# Altium schematic symbol library Regulator_Linear.SchLib: 1452 symbols (part 9 of 10) (continued)
## TPS7A91 (continued)

## TPS7A0508PDBV
designator *  value TPS7A0508PDBV
ki_keywords: Single Output LDO Low-Iq; ki_description: 200-mA Ultra-Low-Iq LDO, 0.8V, SOT-23-5; ki_fp_filters: SOT?23*; Footprint: Package_TO_SOT_SMD:SOT-23-5; Supplier: https://www.ti.com/lit/ds/symlink/tps7a05.pdf
footprint SOT-23-5
pins: 1 IN (power), 2 GND (power), 3 EN (in), 4 NC (in) hidden, 5 OUT (power)

## TPS7A0510PDBV
designator *  value TPS7A0510PDBV
ki_keywords: Single Output LDO Low-Iq; ki_description: 200-mA Ultra-Low-Iq LDO, 1.0V, SOT-23-5; ki_fp_filters: SOT?23*; Footprint: Package_TO_SOT_SMD:SOT-23-5; Supplier: https://www.ti.com/lit/ds/symlink/tps7a05.pdf
footprint SOT-23-5
pins: 1 IN (power), 2 GND (power), 3 EN (in), 4 NC (in) hidden, 5 OUT (power)

## TPS7A0512PDBV
designator *  value TPS7A0512PDBV
ki_keywords: Single Output LDO Low-Iq; ki_description: 200-mA Ultra-Low-Iq LDO, 1.2V, SOT-23-5; ki_fp_filters: SOT?23*; Footprint: Package_TO_SOT_SMD:SOT-23-5; Supplier: https://www.ti.com/lit/ds/symlink/tps7a05.pdf
footprint SOT-23-5
pins: 1 IN (power), 2 GND (power), 3 EN (in), 4 NC (in) hidden, 5 OUT (power)

## TPS7A0515PDBV
designator *  value TPS7A0515PDBV
ki_keywords: Single Output LDO Low-Iq; ki_description: 200-mA Ultra-Low-Iq LDO, 1.5V, SOT-23-5; ki_fp_filters: SOT?23*; Footprint: Package_TO_SOT_SMD:SOT-23-5; Supplier: https://www.ti.com/lit/ds/symlink/tps7a05.pdf
footprint SOT-23-5
pins: 1 IN (power), 2 GND (power), 3 EN (in), 4 NC (in) hidden, 5 OUT (power)

## TPS7A0518PDBV
designator *  value TPS7A0518PDBV
ki_keywords: Single Output LDO Low-Iq; ki_description: 200-mA Ultra-Low-Iq LDO, 1.8V, SOT-23-5; ki_fp_filters: SOT?23*; Footprint: Package_TO_SOT_SMD:SOT-23-5; Supplier: https://www.ti.com/lit/ds/symlink/tps7a05.pdf
footprint SOT-23-5
pins: 1 IN (power), 2 GND (power), 3 EN (in), 4 NC (in) hidden, 5 OUT (power)

## TPS7A0522PDBV
designator *  value TPS7A0522PDBV
ki_keywords: Single Output LDO Low-Iq; ki_description: 200-mA Ultra-Low-Iq LDO, 2.2V, SOT-23-5; ki_fp_filters: SOT?23*; Footprint: Package_TO_SOT_SMD:SOT-23-5; Supplier: https://www.ti.com/lit/ds/symlink/tps7a05.pdf
footprint SOT-23-5
pins: 1 IN (power), 2 GND (power), 3 EN (in), 4 NC (in) hidden, 5 OUT (power)

## TPS7A0525PDBV
designator *  value TPS7A0525PDBV
ki_keywords: Single Output LDO Low-Iq; ki_description: 200-mA Ultra-Low-Iq LDO, 2.5V, SOT-23-5; ki_fp_filters: SOT?23*; Footprint: Package_TO_SOT_SMD:SOT-23-5; Supplier: https://www.ti.com/lit/ds/symlink/tps7a05.pdf
footprint SOT-23-5
pins: 1 IN (power), 2 GND (power), 3 EN (in), 4 NC (in) hidden, 5 OUT (power)

## TPS7A0530PDBV
designator *  value TPS7A0530PDBV
ki_keywords: Single Output LDO Low-Iq; ki_description: 200-mA Ultra-Low-Iq LDO, 3.0V, SOT-23-5; ki_fp_filters: SOT?23*; Footprint: Package_TO_SOT_SMD:SOT-23-5; Supplier: https://www.ti.com/lit/ds/symlink/tps7a05.pdf
footprint SOT-23-5
pins: 1 IN (power), 2 GND (power), 3 EN (in), 4 NC (in) hidden, 5 OUT (power)

## TPS7A0531PDBV
designator *  value TPS7A0531PDBV
ki_keywords: Single Output LDO Low-Iq; ki_description: 200-mA Ultra-Low-Iq LDO, 3.1V, SOT-23-5; ki_fp_filters: SOT?23*; Footprint: Package_TO_SOT_SMD:SOT-23-5; Supplier: https://www.ti.com/lit/ds/symlink/tps7a05.pdf
footprint SOT-23-5
pins: 1 IN (power), 2 GND (power), 3 EN (in), 4 NC (in) hidden, 5 OUT (power)

## TPS7A0533PDBV
designator *  value TPS7A0533PDBV
ki_keywords: Single Output LDO Low-Iq; ki_description: 200-mA Ultra-Low-Iq LDO, 3.3V, SOT-23-5; ki_fp_filters: SOT?23*; Footprint: Package_TO_SOT_SMD:SOT-23-5; Supplier: https://www.ti.com/lit/ds/symlink/tps7a05.pdf
footprint SOT-23-5
pins: 1 IN (power), 2 GND (power), 3 EN (in), 4 NC (in) hidden, 5 OUT (power)

## TPS7A05285PDBV
designator *  value TPS7A05285PDBV
ki_keywords: Single Output LDO Low-Iq; ki_description: 200-mA Ultra-Low-Iq LDO, 2.85V, SOT-23-5; ki_fp_filters: SOT?23*; Footprint: Package_TO_SOT_SMD:SOT-23-5; Supplier: https://www.ti.com/lit/ds/symlink/tps7a05.pdf
footprint SOT-23-5
pins: 1 IN (power), 2 GND (power), 3 EN (in), 4 NC (in) hidden, 5 OUT (power)

## TPS7A7001DDA
designator *  value TPS7A7001DDA
ki_keywords: ldo regulator voltage linear; ki_description: 2A, Low-Dropout Voltage Regulator, 1.425-6.5V Input, Adjustable Min 0.5V Output, PowerPad SO-8; ki_fp_filters: TI*SO*PowerPAD*; Footprint: Package_SO:TI_SO-PowerPAD-8; Supplier: http://www.ti.com/lit/ds/symlink/tps7a7001.pdf
footprint TI_SO-PowerPAD-8
pins: 1 NC (in) hidden, 2 EN (in), 3 IN (power), 4 NC (in) hidden, 5 NC (in) hidden, 6 OUT (power), 7 FB (in), 8 GND (power), 9 EP

## TPS7A7200RGW
designator *  value TPS7A7200RGW
ki_keywords: linear regulator ldo voltage; ki_description: 2A, Low-Dropout Voltage Regulator, 1.5-6.5V Input, Adjustable 0.9-5V Output, VQFN-20; ki_fp_filters: Texas*S?PVQFN*; Footprint: Package_DFN_QFN:Texas_S-PVQFN-N20_EP3.15x3.15mm_ThermalVias; Supplier: http://www.ti.com/lit/ds/symlink/tps7a7200.pdf
footprint Texas_S-PVQFN-N20_EP3.15x3.15mm_ThermalVias
pins: 1 OUT (power), 2 SNS (in), 3 FB (in), 4 PG (oc), 5 50mV (in), 6 100mV (in), 7 200mV (in), 8 GND (power), 9 400mV (in), 10 800mV (in), 11 1.6V (in), 12 NC (in) hidden, 13 SS (in), 14 EN (in), 15 IN (power), 16 IN hidden, 17 IN hidden, 18 GND hidden, 19 OUT hidden, 20 OUT hidden, 21 EP

## TPS7101
designator *  value TPS7101
ki_keywords: LDO Voltage Regulator 500mA Adjustable; ki_description: 500mA Adjustable 1.2-9.75V Low Drop-out Voltage Regulator, SO-8/DIP-8; ki_fp_filters: SOIC*3.9x4.9mm*P1.27mm* DIP*W7.62mm*; Supplier: http://www.ti.com/lit/ds/symlink/tps71.pdf
pins: 1 GND (power), 2 ~{{EN}} (in), 3 IN (power), 4 IN hidden, 5 OUT (power), 6 OUT hidden, 7 FB (in), 8 PG (out)

## TPS7133
designator *  value TPS7133
ki_keywords: LDO Voltage Regulator 500mA; ki_description: 500mA Low Drop-out Voltage Regulator, Fixed Output 3.3V, SO-8/DIP-8; ki_fp_filters: SOIC*3.9x4.9mm*P1.27mm* DIP*W7.62mm*; Supplier: http://www.ti.com/lit/ds/symlink/tps71.pdf
pins: 1 GND (power), 2 ~{{EN}} (in), 3 IN hidden, 4 IN (power), 5 OUT hidden, 6 OUT (power), 7 SENSE (in), 8 PG (out)

## TPS7148
designator *  value TPS7148
ki_keywords: LDO Voltage Regulator 500mA; ki_description: 500mA Low Drop-out Voltage Regulator, Fixed Output 4.85V, SO-8/DIP-8; ki_fp_filters: SOIC*3.9x4.9mm*P1.27mm* DIP*W7.62mm*; Supplier: http://www.ti.com/lit/ds/symlink/tps71.pdf
pins: 1 GND (power), 2 ~{{EN}} (in), 3 IN hidden, 4 IN (power), 5 OUT hidden, 6 OUT (power), 7 SENSE (in), 8 PG (out)

## TPS7150
designator *  value TPS7150
ki_keywords: LDO Voltage Regulator 500mA; ki_description: 500mA Low Drop-out Voltage Regulator, Fixed Output 5V, SO-8/DIP-8; ki_fp_filters: SOIC*3.9x4.9mm*P1.27mm* DIP*W7.62mm*; Supplier: http://www.ti.com/lit/ds/symlink/tps71.pdf
pins: 1 GND (power), 2 ~{{EN}} (in), 3 IN hidden, 4 IN (power), 5 OUT hidden, 6 OUT (power), 7 SENSE (in), 8 PG (out)

## TPS51200DRC
designator *  value TPS51200DRC
ki_keywords: DDR LDO; ki_description: Sink and Source DDR Termination Regulator, VSON-10; ki_fp_filters: *VSON?10?1EP?3x3mm?P0.5mm*; Footprint: Package_SON:VSON-10-1EP_3x3mm_P0.5mm_EP1.65x2.4mm; Supplier: http://www.ti.com/lit/ds/symlink/tps51200.pdf
footprint VSON-10-1EP_3x3mm_P0.5mm_EP1.65x2.4mm
pins: 1 REFIN (in), 2 VLDOIN (power), 3 VO (power), 4 GND hidden, 5 VOSNS (in), 6 REFOUT (out), 7 EN (in), 8 GND (power), 9 PGOOD (oc), 10 VIN (power), 11 GND hidden

## TPS70202_HTSSOP20
designator *  value TPS70202_HTSSOP20
ki_keywords: Dual LDO Adjustable Regulator 500mA 250mA Voltage Supervisor; ki_description: 500mA/250mA Dual Adjustable Low Drop-out Regulator with Voltage Supervisor, PowerPAD TSSOP-20; ki_fp_filters: HTSSOP*4.4x6.5mm*P0.65mm*; Footprint: Package_SO:HTSSOP-20-1EP_4.4x6.5mm_P0.65mm_EP3.4x6.5mm_ThermalVias; Supplier: http://www.ti.com/lit/ds/symlink/tps702.pdf
footprint HTSSOP-20-1EP_4.4x6.5mm_P0.65mm_EP3.4x6.5mm_ThermalVias
pins: 1 NC (in) hidden, 2 VIN1 hidden, 3 VIN1 (power), 4 ~{{MR}} (in), 5 ~{{EN1}} (in), 6 ~{{EN2}} (in), 7 ~{{RESET}} (oc), 8 GND (power), 9 VIN2 hidden, 10 VIN2 (power), 11 NC (in) hidden, 12 VOUT2 hidden, 13 VOUT2 (power), 14 FB2 (in), 15 PG2 (oc), 16 PG1 (oc), 17 FB1 (in), 18 VOUT1 hidden, 19 VOUT1 (power), 20 NC (in) hidden, 21 PAD (power)

## TPS70245_HTSSOP20
designator *  value TPS70245_HTSSOP20
ki_keywords: Dual 3.3V 1.2V LDO Regulator 500mA 250mA Voltage Supervisor; ki_description: 3.3V 500mA/1.2V 250mA Dual Low Drop-out Regulator with Voltage Supervisor, PowerPAD TSSOP-20; ki_fp_filters: HTSSOP*4.4x6.5mm*P0.65mm*; Footprint: Package_SO:HTSSOP-20-1EP_4.4x6.5mm_P0.65mm_EP3.4x6.5mm_ThermalVias; Supplier: http://www.ti.com/lit/ds/symlink/tps702.pdf
footprint HTSSOP-20-1EP_4.4x6.5mm_P0.65mm_EP3.4x6.5mm_ThermalVias
pins: 1 NC (in) hidden, 2 VIN1 hidden, 3 VIN1 (power), 4 ~{{MR}} (in), 5 ~{{EN1}} (in), 6 ~{{EN2}} (in), 7 ~{{RESET}} (oc), 8 GND (power), 9 VIN2 hidden, 10 VIN2 (power), 11 NC (in) hidden, 12 VOUT2 hidden, 13 VOUT2 (power), 14 VSENS2 (in), 15 PG2 (oc), 16 PG1 (oc), 17 VSENS1 (in), 18 VOUT1 hidden, 19 VOUT1 (power), 20 NC (in) hidden, 21 PAD (power)

## TPS70248_HTSSOP20
designator *  value TPS70248_HTSSOP20
ki_keywords: Dual 3.3V 1.5V LDO Regulator 500mA 250mA Voltage Supervisor; ki_description: 3.3V 500mA/1.5V 250mA Dual Low Drop-out Regulator with Voltage Supervisor, PowerPAD TSSOP-20; ki_fp_filters: HTSSOP*4.4x6.5mm*P0.65mm*; Footprint: Package_SO:HTSSOP-20-1EP_4.4x6.5mm_P0.65mm_EP3.4x6.5mm_ThermalVias; Supplier: http://www.ti.com/lit/ds/symlink/tps702.pdf
footprint HTSSOP-20-1EP_4.4x6.5mm_P0.65mm_EP3.4x6.5mm_ThermalVias
pins: 1 NC (in) hidden, 2 VIN1 hidden, 3 VIN1 (power), 4 ~{{MR}} (in), 5 ~{{EN1}} (in), 6 ~{{EN2}} (in), 7 ~{{RESET}} (oc), 8 GND (power), 9 VIN2 hidden, 10 VIN2 (power), 11 NC (in) hidden, 12 VOUT2 hidden, 13 VOUT2 (power), 14 VSENS2 (in), 15 PG2 (oc), 16 PG1 (oc), 17 VSENS1 (in), 18 VOUT1 hidden, 19 VOUT1 (power), 20 NC (in) hidden, 21 PAD (power)

## TPS70251_HTSSOP20
designator *  value TPS70251_HTSSOP20
ki_keywords: Dual 3.3V 1.8V LDO Regulator 500mA 250mA Voltage Supervisor; ki_description: 3.3V 500mA/1.8V 250mA Dual Low Drop-out Regulator with Voltage Supervisor, PowerPAD TSSOP-20; ki_fp_filters: HTSSOP*4.4x6.5mm*P0.65mm*; Footprint: Package_SO:HTSSOP-20-1EP_4.4x6.5mm_P0.65mm_EP3.4x6.5mm_ThermalVias; Supplier: http://www.ti.com/lit/ds/symlink/tps702.pdf
footprint HTSSOP-20-1EP_4.4x6.5mm_P0.65mm_EP3.4x6.5mm_ThermalVias
pins: 1 NC (in) hidden, 2 VIN1 hidden, 3 VIN1 (power), 4 ~{{MR}} (in), 5 ~{{EN1}} (in), 6 ~{{EN2}} (in), 7 ~{{RESET}} (oc), 8 GND (power), 9 VIN2 hidden, 10 VIN2 (power), 11 NC (in) hidden, 12 VOUT2 hidden, 13 VOUT2 (power), 14 VSENS2 (in), 15 PG2 (oc), 16 PG1 (oc), 17 VSENS1 (in), 18 VOUT1 hidden, 19 VOUT1 (power), 20 NC (in) hidden, 21 PAD (power)

## TPS70258_HTSSOP20
designator *  value TPS70258_HTSSOP20
ki_keywords: Dual 3.3V 2.5V LDO Regulator 500mA 250mA Voltage Supervisor; ki_description: 3.3V 500mA/2.5V 250mA Dual Low Drop-out Regulator with Voltage Supervisor, PowerPAD TSSOP-20; ki_fp_filters: HTSSOP*4.4x6.5mm*P0.65mm*; Footprint: Package_SO:HTSSOP-20-1EP_4.4x6.5mm_P0.65mm_EP3.4x6.5mm_ThermalVias; Supplier: http://www.ti.com/lit/ds/symlink/tps702.pdf
footprint HTSSOP-20-1EP_4.4x6.5mm_P0.65mm_EP3.4x6.5mm_ThermalVias
pins: 1 NC (in) hidden, 2 VIN1 hidden, 3 VIN1 (power), 4 ~{{MR}} (in), 5 ~{{EN1}} (in), 6 ~{{EN2}} (in), 7 ~{{RESET}} (oc), 8 GND (power), 9 VIN2 hidden, 10 VIN2 (power), 11 NC (in) hidden, 12 VOUT2 hidden, 13 VOUT2 (power), 14 VSENS2 (in), 15 PG2 (oc), 16 PG1 (oc), 17 VSENS1 (in), 18 VOUT1 hidden, 19 VOUT1 (power), 20 NC (in) hidden, 21 PAD (power)

## TPS70302
designator *  value TPS70302
ki_keywords: dual ldo regulator; ki_description: Dual-Output, Low Dropout Voltage Regulators With Integrated SVS For Split Voltage Systems, Sequenced Outputs, ADJ 1A/ADJ 2A, HTSSOP-24; ki_fp_filters: HTSSOP*4.4x7.8mm*P0.65mm*; Footprint: Package_SO:HTSSOP-24-1EP_4.4x7.8mm_P0.65mm_EP3.4x7.8mm_Mask2.4x4.68mm_ThermalVias; Supplier: http://www.ti.com/lit/ds/symlink/tps703.pdf
footprint HTSSOP-24-1EP_4.4x7.8mm_P0.65mm_EP3.4x7.8mm_Mask2.4x4.68mm_ThermalVias
pins: 1 GND/HS hidden, 2 VIN1 (power), 3 VIN1 hidden, 4 NC (in) hidden, 5 ~{{MR2}} (in), 6 ~{{MR1}} (in), 7 ~{{EN}} (in), 8 SEQ (in), 9 GND (power), 10 VIN2 (power), 11 VIN2 hidden, 12 GND/HS hidden, 13 GND/HS hidden, 14 VOUT2 (power), 15 VOUT2 hidden, 16 VSENSE2/FB2 (in), 17 NC (in) hidden, 18 ~{{RESET}} (oc), 19 PG1 (oc), 20 NC (in) hidden, 21 VSENSE1/FB1 (in), 22 VOUT1 (power), 23 VOUT1 hidden, 24 GND/HS hidden, 25 GND/HS (power)

## TPS70345
designator *  value TPS70345
ki_keywords: dual ldo regulator; ki_description: Dual-Output, Low Dropout Voltage Regulators With Integrated SVS For Split Voltage Systems, Sequenced Outputs, 3.3V 1A/1.2V 2A, HTSSOP-24; ki_fp_filters: HTSSOP*4.4x7.8mm*P0.65mm*; Footprint: Package_SO:HTSSOP-24-1EP_4.4x7.8mm_P0.65mm_EP3.4x7.8mm_Mask2.4x4.68mm_ThermalVias; Supplier: http://www.ti.com/lit/ds/symlink/tps703.pdf
footprint HTSSOP-24-1EP_4.4x7.8mm_P0.65mm_EP3.4x7.8mm_Mask2.4x4.68mm_ThermalVias
pins: 1 GND/HS hidden, 2 VIN1 (power), 3 VIN1 hidden, 4 NC (in) hidden, 5 ~{{MR2}} (in), 6 ~{{MR1}} (in), 7 ~{{EN}} (in), 8 SEQ (in), 9 GND (power), 10 VIN2 (power), 11 VIN2 hidden, 12 GND/HS hidden, 13 GND/HS hidden, 14 VOUT2 (power), 15 VOUT2 hidden, 16 VSENSE2/FB2 (in), 17 NC (in) hidden, 18 ~{{RESET}} (oc), 19 PG1 (oc), 20 NC (in) hidden, 21 VSENSE1/FB1 (in), 22 VOUT1 (power), 23 VOUT1 hidden, 24 GND/HS hidden, 25 GND/HS (power)

## TPS70348
designator *  value TPS70348
ki_keywords: dual ldo regulator; ki_description: Dual-Output, Low Dropout Voltage Regulators With Integrated SVS For Split Voltage Systems, Sequenced Outputs, 3.3V 1A/1.5V 2A, HTSSOP-24; ki_fp_filters: HTSSOP*4.4x7.8mm*P0.65mm*; Footprint: Package_SO:HTSSOP-24-1EP_4.4x7.8mm_P0.65mm_EP3.4x7.8mm_Mask2.4x4.68mm_ThermalVias; Supplier: http://www.ti.com/lit/ds/symlink/tps703.pdf
footprint HTSSOP-24-1EP_4.4x7.8mm_P0.65mm_EP3.4x7.8mm_Mask2.4x4.68mm_ThermalVias
pins: 1 GND/HS hidden, 2 VIN1 (power), 3 VIN1 hidden, 4 NC (in) hidden, 5 ~{{MR2}} (in), 6 ~{{MR1}} (in), 7 ~{{EN}} (in), 8 SEQ (in), 9 GND (power), 10 VIN2 (power), 11 VIN2 hidden, 12 GND/HS hidden, 13 GND/HS hidden, 14 VOUT2 (power), 15 VOUT2 hidden, 16 VSENSE2/FB2 (in), 17 NC (in) hidden, 18 ~{{RESET}} (oc), 19 PG1 (oc), 20 NC (in) hidden, 21 VSENSE1/FB1 (in), 22 VOUT1 (power), 23 VOUT1 hidden, 24 GND/HS hidden, 25 GND/HS (power)

## TPS70351
designator *  value TPS70351
ki_keywords: dual ldo regulator; ki_description: Dual-Output, Low Dropout Voltage Regulators With Integrated SVS For Split Voltage Systems, Sequenced Outputs, 3.3V 1A/1.8V 2A, HTSSOP-24; ki_fp_filters: HTSSOP*4.4x7.8mm*P0.65mm*; Footprint: Package_SO:HTSSOP-24-1EP_4.4x7.8mm_P0.65mm_EP3.4x7.8mm_Mask2.4x4.68mm_ThermalVias; Supplier: http://www.ti.com/lit/ds/symlink/tps703.pdf
footprint HTSSOP-24-1EP_4.4x7.8mm_P0.65mm_EP3.4x7.8mm_Mask2.4x4.68mm_ThermalVias
pins: 1 GND/HS hidden, 2 VIN1 (power), 3 VIN1 hidden, 4 NC (in) hidden, 5 ~{{MR2}} (in), 6 ~{{MR1}} (in), 7 ~{{EN}} (in), 8 SEQ (in), 9 GND (power), 10 VIN2 (power), 11 VIN2 hidden, 12 GND/HS hidden, 13 GND/HS hidden, 14 VOUT2 (power), 15 VOUT2 hidden, 16 VSENSE2/FB2 (in), 17 NC (in) hidden, 18 ~{{RESET}} (oc), 19 PG1 (oc), 20 NC (in) hidden, 21 VSENSE1/FB1 (in), 22 VOUT1 (power), 23 VOUT1 hidden, 24 GND/HS hidden, 25 GND/HS (power)

## TPS70358
designator *  value TPS70358
ki_keywords: dual ldo regulator; ki_description: Dual-Output, Low Dropout Voltage Regulators With Integrated SVS For Split Voltage Systems, Sequenced Outputs, 3.3V 1A/2.5V 2A, HTSSOP-24; ki_fp_filters: HTSSOP*4.4x7.8mm*P0.65mm*; Footprint: Package_SO:HTSSOP-24-1EP_4.4x7.8mm_P0.65mm_EP3.4x7.8mm_Mask2.4x4.68mm_ThermalVias; Supplier: http://www.ti.com/lit/ds/symlink/tps703.pdf
footprint HTSSOP-24-1EP_4.4x7.8mm_P0.65mm_EP3.4x7.8mm_Mask2.4x4.68mm_ThermalVias
pins: 1 GND/HS hidden, 2 VIN1 (power), 3 VIN1 hidden, 4 NC (in) hidden, 5 ~{{MR2}} (in), 6 ~{{MR1}} (in), 7 ~{{EN}} (in), 8 SEQ (in), 9 GND (power), 10 VIN2 (power), 11 VIN2 hidden, 12 GND/HS hidden, 13 GND/HS hidden, 14 VOUT2 (power), 15 VOUT2 hidden, 16 VSENSE2/FB2 (in), 17 NC (in) hidden, 18 ~{{RESET}} (oc), 19 PG1 (oc), 20 NC (in) hidden, 21 VSENSE1/FB1 (in), 22 VOUT1 (power), 23 VOUT1 hidden, 24 GND/HS hidden, 25 GND/HS (power)

## TPS70402
designator *  value TPS70402
ki_keywords: dual ldo regulator; ki_description: Dual-Output, Low Dropout Voltage Regulators With Integrated SVS For Split Voltage Systems, Independent Enable, ADJ 1A/ADJ 2A, HTSSOP-24; ki_fp_filters: HTSSOP*4.4x7.8mm*P0.65mm*; Footprint: Package_SO:HTSSOP-24-1EP_4.4x7.8mm_P0.65mm_EP3.4x7.8mm_Mask2.4x4.68mm_ThermalVias; Supplier: http://www.ti.com/lit/ds/symlink/tps704.pdf
footprint HTSSOP-24-1EP_4.4x7.8mm_P0.65mm_EP3.4x7.8mm_Mask2.4x4.68mm_ThermalVias
pins: 1 GND/HS hidden, 2 VIN1 (power), 3 VIN1 hidden, 4 NC (in) hidden, 5 ~{{MR}} (in), 6 ~{{EN1}} (in), 7 ~{{EN2}} (in), 8 ~{{RESET}} (oc), 9 GND (power), 10 VIN2 (power), 11 VIN2 hidden, 12 GND/HS hidden, 13 GND/HS hidden, 14 VOUT2 (power), 15 VOUT2 hidden, 16 VSENSE2/FB2 (in), 17 NC (in) hidden, 18 PG2 (oc), 19 PG1 (oc), 20 NC (in) hidden, 21 VSENSE1/FB1 (in), 22 VOUT1 (power), 23 VOUT1 hidden, 24 GND/HS hidden, 25 GND/HS (power)

## TPS70445
designator *  value TPS70445
ki_keywords: dual ldo regulator; ki_description: Dual-Output, Low Dropout Voltage Regulators With Integrated SVS For Split Voltage Systems, Independent Enable, 3.3V 1A/1.2V 2A, HTSSOP-24; ki_fp_filters: HTSSOP*4.4x7.8mm*P0.65mm*; Footprint: Package_SO:HTSSOP-24-1EP_4.4x7.8mm_P0.65mm_EP3.4x7.8mm_Mask2.4x4.68mm_ThermalVias; Supplier: http://www.ti.com/lit/ds/symlink/tps704.pdf
footprint HTSSOP-24-1EP_4.4x7.8mm_P0.65mm_EP3.4x7.8mm_Mask2.4x4.68mm_ThermalVias
pins: 1 GND/HS hidden, 2 VIN1 (power), 3 VIN1 hidden, 4 NC (in) hidden, 5 ~{{MR}} (in), 6 ~{{EN1}} (in), 7 ~{{EN2}} (in), 8 ~{{RESET}} (oc), 9 GND (power), 10 VIN2 (power), 11 VIN2 hidden, 12 GND/HS hidden, 13 GND/HS hidden, 14 VOUT2 (power), 15 VOUT2 hidden, 16 VSENSE2/FB2 (in), 17 NC (in) hidden, 18 PG2 (oc), 19 PG1 (oc), 20 NC (in) hidden, 21 VSENSE1/FB1 (in), 22 VOUT1 (power), 23 VOUT1 hidden, 24 GND/HS hidden, 25 GND/HS (power)

## TPS70448
designator *  value TPS70448
ki_keywords: dual ldo regulator; ki_description: Dual-Output, Low Dropout Voltage Regulators With Integrated SVS For Split Voltage Systems, Independent Enable, 3.3V 1A/1.5V 2A, HTSSOP-24; ki_fp_filters: HTSSOP*4.4x7.8mm*P0.65mm*; Footprint: Package_SO:HTSSOP-24-1EP_4.4x7.8mm_P0.65mm_EP3.4x7.8mm_Mask2.4x4.68mm_ThermalVias; Supplier: http://www.ti.com/lit/ds/symlink/tps704.pdf
footprint HTSSOP-24-1EP_4.4x7.8mm_P0.65mm_EP3.4x7.8mm_Mask2.4x4.68mm_ThermalVias
pins: 1 GND/HS hidden, 2 VIN1 (power), 3 VIN1 hidden, 4 NC (in) hidden, 5 ~{{MR}} (in), 6 ~{{EN1}} (in), 7 ~{{EN2}} (in), 8 ~{{RESET}} (oc), 9 GND (power), 10 VIN2 (power), 11 VIN2 hidden, 12 GND/HS hidden, 13 GND/HS hidden, 14 VOUT2 (power), 15 VOUT2 hidden, 16 VSENSE2/FB2 (in), 17 NC (in) hidden, 18 PG2 (oc), 19 PG1 (oc), 20 NC (in) hidden, 21 VSENSE1/FB1 (in), 22 VOUT1 (power), 23 VOUT1 hidden, 24 GND/HS hidden, 25 GND/HS (power)

## TPS70451
designator *  value TPS70451
ki_keywords: dual ldo regulator; ki_description: Dual-Output, Low Dropout Voltage Regulators With Integrated SVS For Split Voltage Systems, Independent Enable, 3.3V 1A/1.8V 2A, HTSSOP-24; ki_fp_filters: HTSSOP*4.4x7.8mm*P0.65mm*; Footprint: Package_SO:HTSSOP-24-1EP_4.4x7.8mm_P0.65mm_EP3.4x7.8mm_Mask2.4x4.68mm_ThermalVias; Supplier: http://www.ti.com/lit/ds/symlink/tps704.pdf
footprint HTSSOP-24-1EP_4.4x7.8mm_P0.65mm_EP3.4x7.8mm_Mask2.4x4.68mm_ThermalVias
pins: 1 GND/HS hidden, 2 VIN1 (power), 3 VIN1 hidden, 4 NC (in) hidden, 5 ~{{MR}} (in), 6 ~{{EN1}} (in), 7 ~{{EN2}} (in), 8 ~{{RESET}} (oc), 9 GND (power), 10 VIN2 (power), 11 VIN2 hidden, 12 GND/HS hidden, 13 GND/HS hidden, 14 VOUT2 (power), 15 VOUT2 hidden, 16 VSENSE2/FB2 (in), 17 NC (in) hidden, 18 PG2 (oc), 19 PG1 (oc), 20 NC (in) hidden, 21 VSENSE1/FB1 (in), 22 VOUT1 (power), 23 VOUT1 hidden, 24 GND/HS hidden, 25 GND/HS (power)

## TPS70458
designator *  value TPS70458
ki_keywords: dual ldo regulator; ki_description: Dual-Output, Low Dropout Voltage Regulators With Integrated SVS For Split Voltage Systems, Independent Enable, 3.3V 1A/2.5V 2A, HTSSOP-24; ki_fp_filters: HTSSOP*4.4x7.8mm*P0.65mm*; Footprint: Package_SO:HTSSOP-24-1EP_4.4x7.8mm_P0.65mm_EP3.4x7.8mm_Mask2.4x4.68mm_ThermalVias; Supplier: http://www.ti.com/lit/ds/symlink/tps704.pdf
footprint HTSSOP-24-1EP_4.4x7.8mm_P0.65mm_EP3.4x7.8mm_Mask2.4x4.68mm_ThermalVias
pins: 1 GND/HS hidden, 2 VIN1 (power), 3 VIN1 hidden, 4 NC (in) hidden, 5 ~{{MR}} (in), 6 ~{{EN1}} (in), 7 ~{{EN2}} (in), 8 ~{{RESET}} (oc), 9 GND (power), 10 VIN2 (power), 11 VIN2 hidden, 12 GND/HS hidden, 13 GND/HS hidden, 14 VOUT2 (power), 15 VOUT2 hidden, 16 VSENSE2/FB2 (in), 17 NC (in) hidden, 18 PG2 (oc), 19 PG1 (oc), 20 NC (in) hidden, 21 VSENSE1/FB1 (in), 22 VOUT1 (power), 23 VOUT1 hidden, 24 GND/HS hidden, 25 GND/HS (power)

## TPS71518__SC70
designator *  value TPS71518__SC70
ki_keywords: LDO regulator voltage; ki_description: Low-drop Voltage Regulator, Io up to 50mA, Fixed Vo 1.8V, Ignd 3.2uA , SC70.; ki_fp_filters: *SC?70*; Footprint: Package_TO_SOT_SMD:SOT-353_SC-70-5; Supplier: http://www.ti.com/lit/ds/symlink/tps715.pdf
footprint SOT-353_SC-70-5
pins: 1 NC (in) hidden, 2 GND (power), 3 NC (in) hidden, 4 IN (power), 5 OUT (power)

## TPS71519__SC70
designator *  value TPS71519__SC70
ki_keywords: LDO regulator voltage; ki_description: Low-drop Voltage Regulator, Io up to 50mA, Fixed Vo 1.9V, Ignd 3.2uA , SC70.; ki_fp_filters: *SC?70*; Footprint: Package_TO_SOT_SMD:SOT-353_SC-70-5; Supplier: http://www.ti.com/lit/ds/symlink/tps715.pdf
footprint SOT-353_SC-70-5
pins: 1 NC (in) hidden, 2 GND (power), 3 NC (in) hidden, 4 IN (power), 5 OUT (power)

## TPS71523__SC70
designator *  value TPS71523__SC70
ki_keywords: LDO regulator voltage; ki_description: Low-drop Voltage Regulator, Io up to 50mA, Fixed Vo 2.3V, Ignd 3.2uA , SC70.; ki_fp_filters: *SC?70*; Footprint: Package_TO_SOT_SMD:SOT-353_SC-70-5; Supplier: http://www.ti.com/lit/ds/symlink/tps715.pdf
footprint SOT-353_SC-70-5
pins: 1 NC (in) hidden, 2 GND (power), 3 NC (in) hidden, 4 IN (power), 5 OUT (power)

## TPS71525__SC70
designator *  value TPS71525__SC70
ki_keywords: LDO regulator voltage; ki_description: Low-drop Voltage Regulator, Io up to 50mA, Fixed Vo 2.5V, Ignd 3.2uA , SC70.; ki_fp_filters: *SC?70*; Footprint: Package_TO_SOT_SMD:SOT-353_SC-70-5; Supplier: http://www.ti.com/lit/ds/symlink/tps715.pdf
footprint SOT-353_SC-70-5
pins: 1 NC (in) hidden, 2 GND (power), 3 NC (in) hidden, 4 IN (power), 5 OUT (power)

## TPS71530__SC70
designator *  value TPS71530__SC70
ki_keywords: LDO regulator voltage; ki_description: Low-drop Voltage Regulator, Io up to 50mA, Fixed Vo 3V, Ignd 3.2uA , SC70.; ki_fp_filters: *SC?70*; Footprint: Package_TO_SOT_SMD:SOT-353_SC-70-5; Supplier: http://www.ti.com/lit/ds/symlink/tps715.pdf
footprint SOT-353_SC-70-5
pins: 1 NC (in) hidden, 2 GND (power), 3 NC (in) hidden, 4 IN (power), 5 OUT (power)

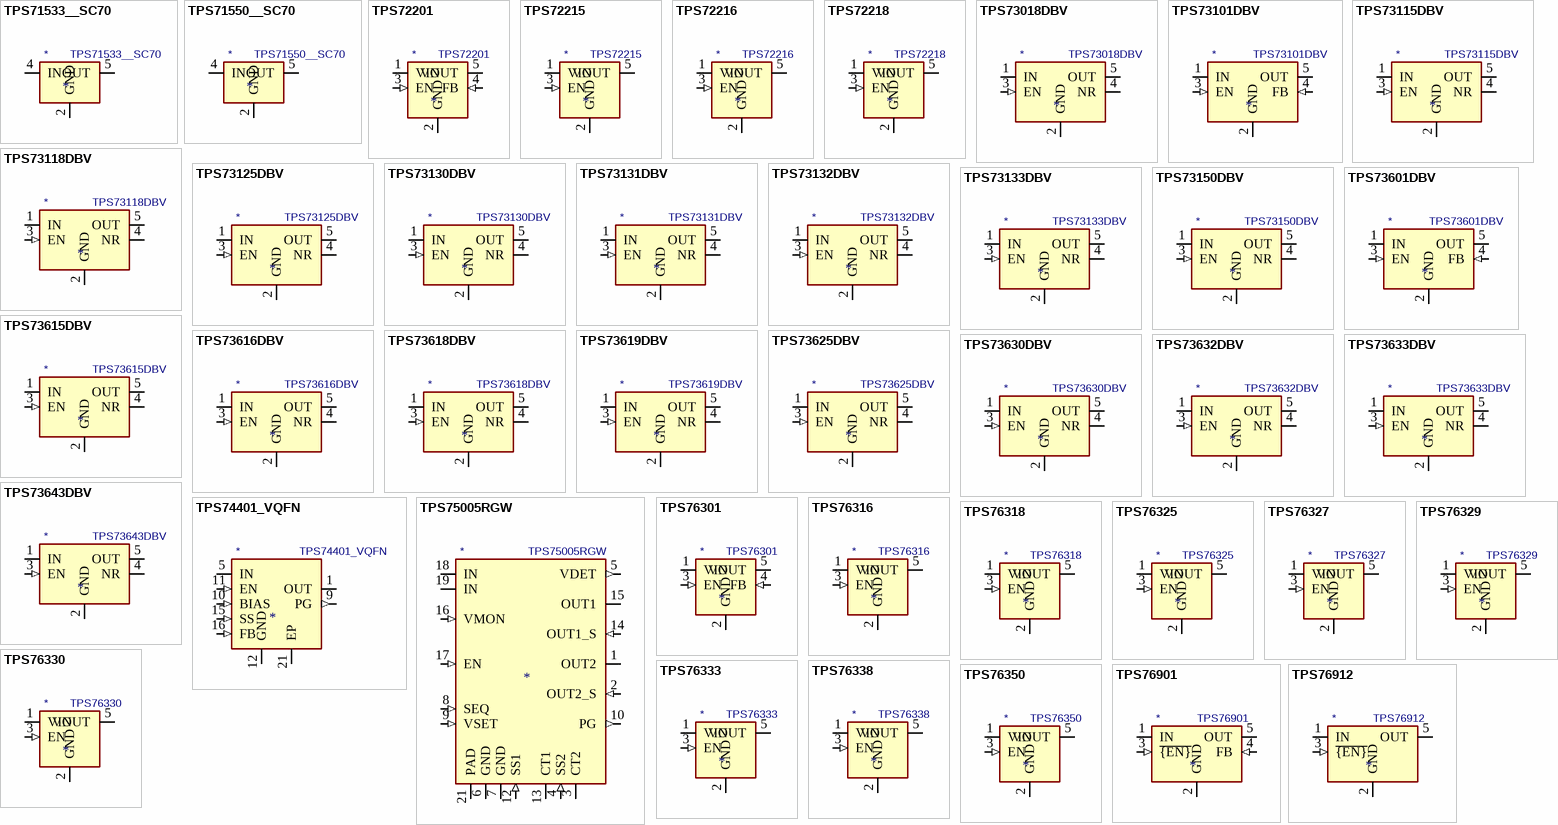
[diagram p34: symbols TPS71533__SC70 to TPS76912]

## TPS71533__SC70
designator *  value TPS71533__SC70
ki_keywords: LDO regulator voltage; ki_description: Low-drop Voltage Regulator, Io up to 50mA, Fixed Vo 3.3V, Ignd 3.2uA , SC70.; ki_fp_filters: *SC?70*; Footprint: Package_TO_SOT_SMD:SOT-353_SC-70-5; Supplier: http://www.ti.com/lit/ds/symlink/tps715.pdf
footprint SOT-353_SC-70-5
pins: 1 NC (in) hidden, 2 GND (power), 3 NC (in) hidden, 4 IN (power), 5 OUT (power)

## TPS71550__SC70
designator *  value TPS71550__SC70
ki_keywords: LDO regulator voltage; ki_description: Low-drop Voltage Regulator, Io up to 50mA, Fixed Vo 5V, Ignd 3.2uA , SC70.; ki_fp_filters: *SC?70*; Footprint: Package_TO_SOT_SMD:SOT-353_SC-70-5; Supplier: http://www.ti.com/lit/ds/symlink/tps715.pdf
footprint SOT-353_SC-70-5
pins: 1 NC (in) hidden, 2 GND (power), 3 NC (in) hidden, 4 IN (power), 5 OUT (power)

## TPS72201
designator *  value TPS72201
ki_keywords: linear low dropout Regulator adjustable; ki_description: Low input voltage 50mA LDO variable output voltage, SOT-23-5; ki_fp_filters: SOT?23*; Footprint: Package_TO_SOT_SMD:SOT-23-5; Supplier: http://www.ti.com/lit/ds/symlink/tps722.pdf
footprint SOT-23-5
pins: 1 VIN (power), 2 GND (power), 3 EN (in), 4 FB (in), 5 VOUT (power)

## TPS72215
designator *  value TPS72215
ki_keywords: linear low dropout Regulator fixed; ki_description: Low input voltage 50mA LDO, 1.5V fixed output voltage, SOT-23-5; ki_fp_filters: SOT?23*; Footprint: Package_TO_SOT_SMD:SOT-23-5; Supplier: http://www.ti.com/lit/ds/symlink/tps722.pdf
footprint SOT-23-5
pins: 1 VIN (power), 2 GND (power), 3 EN (in), 4 NC (in) hidden, 5 VOUT (power)

## TPS72216
designator *  value TPS72216
ki_keywords: linear low dropout Regulator fixed; ki_description: Low input voltage 50mA LDO, 1.6V fixed output voltage, SOT-23-5; ki_fp_filters: SOT?23*; Footprint: Package_TO_SOT_SMD:SOT-23-5; Supplier: http://www.ti.com/lit/ds/symlink/tps722.pdf
footprint SOT-23-5
pins: 1 VIN (power), 2 GND (power), 3 EN (in), 4 NC (in) hidden, 5 VOUT (power)

## TPS72218
designator *  value TPS72218
ki_keywords: linear low dropout Regulator fixed; ki_description: Low input voltage 50mA LDO, 1.8V fixed output voltage, SOT-23-5; ki_fp_filters: SOT?23*; Footprint: Package_TO_SOT_SMD:SOT-23-5; Supplier: http://www.ti.com/lit/ds/symlink/tps722.pdf
footprint SOT-23-5
pins: 1 VIN (power), 2 GND (power), 3 EN (in), 4 NC (in) hidden, 5 VOUT (power)

## TPS73018DBV
designator *  value TPS73018DBV
ki_keywords: Fixed LDO 200mA; ki_description: Low Noise, High PSRR, 200mA Low Drop 1.8V Regulator, SOT-23-5; ki_fp_filters: SOT?23*; Footprint: Package_TO_SOT_SMD:SOT-23-5; Supplier: https://www.ti.com/lit/ds/symlink/tps730.pdf
footprint SOT-23-5
pins: 1 IN (power), 2 GND (power), 3 EN (in), 4 NR, 5 OUT (power)

## TPS73101DBV
designator *  value TPS73101DBV
ki_keywords: Cap free Adjustable LDO 150mA; ki_description: Cap free NMOS 150mA Low Drop Adjustable Out Regulator, SOT-23-5; ki_fp_filters: SOT?23*; Footprint: Package_TO_SOT_SMD:SOT-23-5; Supplier: http://www.ti.com/lit/ds/symlink/tps731.pdf
footprint SOT-23-5
pins: 1 IN (power), 2 GND (power), 3 EN (in), 4 FB (in), 5 OUT (power)

## TPS73115DBV
designator *  value TPS73115DBV
ki_keywords: Cap free Fixed LDO 150mA; ki_description: Cap free NMOS 150mA Low Drop 1.5V Regulator, SOT-23-5; ki_fp_filters: SOT?23*; Footprint: Package_TO_SOT_SMD:SOT-23-5; Supplier: http://www.ti.com/lit/ds/symlink/tps731.pdf
footprint SOT-23-5
pins: 1 IN (power), 2 GND (power), 3 EN (in), 4 NR, 5 OUT (power)

## TPS73118DBV
designator *  value TPS73118DBV
ki_keywords: Cap free Fixed LDO 150mA; ki_description: Cap free NMOS 150mA Low Drop 1.8V Regulator, SOT-23-5; ki_fp_filters: SOT?23*; Footprint: Package_TO_SOT_SMD:SOT-23-5; Supplier: http://www.ti.com/lit/ds/symlink/tps731.pdf
footprint SOT-23-5
pins: 1 IN (power), 2 GND (power), 3 EN (in), 4 NR, 5 OUT (power)

## TPS73125DBV
designator *  value TPS73125DBV
ki_keywords: Cap free Fixed LDO 150mA; ki_description: Cap free NMOS 150mA Low Drop 2.5V Regulator, SOT-23-5; ki_fp_filters: SOT?23*; Footprint: Package_TO_SOT_SMD:SOT-23-5; Supplier: http://www.ti.com/lit/ds/symlink/tps731.pdf
footprint SOT-23-5
pins: 1 IN (power), 2 GND (power), 3 EN (in), 4 NR, 5 OUT (power)

## TPS73130DBV
designator *  value TPS73130DBV
ki_keywords: Cap free Fixed LDO 150mA; ki_description: Cap free NMOS 150mA Low Drop 3.0V Regulator, SOT-23-5; ki_fp_filters: SOT?23*; Footprint: Package_TO_SOT_SMD:SOT-23-5; Supplier: http://www.ti.com/lit/ds/symlink/tps731.pdf
footprint SOT-23-5
pins: 1 IN (power), 2 GND (power), 3 EN (in), 4 NR, 5 OUT (power)

## TPS73131DBV
designator *  value TPS73131DBV
ki_keywords: Cap free Fixed LDO 150mA; ki_description: Cap free NMOS 150mA Low Drop 3.1V Regulator, SOT-23-5; ki_fp_filters: SOT?23*; Footprint: Package_TO_SOT_SMD:SOT-23-5; Supplier: http://www.ti.com/lit/ds/symlink/tps731.pdf
footprint SOT-23-5
pins: 1 IN (power), 2 GND (power), 3 EN (in), 4 NR, 5 OUT (power)

## TPS73132DBV
designator *  value TPS73132DBV
ki_keywords: Cap free Fixed LDO 150mA; ki_description: Cap free NMOS 150mA Low Drop 3.2V Regulator, SOT-23-5; ki_fp_filters: SOT?23*; Footprint: Package_TO_SOT_SMD:SOT-23-5; Supplier: http://www.ti.com/lit/ds/symlink/tps731.pdf
footprint SOT-23-5
pins: 1 IN (power), 2 GND (power), 3 EN (in), 4 NR, 5 OUT (power)

## TPS73133DBV
designator *  value TPS73133DBV
ki_keywords: Cap free Fixed LDO 150mA; ki_description: Cap free NMOS 150mA Low Drop 3.3V Regulator, SOT-23-5; ki_fp_filters: SOT?23*; Footprint: Package_TO_SOT_SMD:SOT-23-5; Supplier: http://www.ti.com/lit/ds/symlink/tps731.pdf
footprint SOT-23-5
pins: 1 IN (power), 2 GND (power), 3 EN (in), 4 NR, 5 OUT (power)

## TPS73150DBV
designator *  value TPS73150DBV
ki_keywords: Cap free Fixed LDO 150mA; ki_description: Cap free NMOS 150mA Low Drop 5.0V Regulator, SOT-23-5; ki_fp_filters: SOT?23*; Footprint: Package_TO_SOT_SMD:SOT-23-5; Supplier: http://www.ti.com/lit/ds/symlink/tps731.pdf
footprint SOT-23-5
pins: 1 IN (power), 2 GND (power), 3 EN (in), 4 NR, 5 OUT (power)

## TPS73601DBV
designator *  value TPS73601DBV
ki_keywords: Cap free Adjustable LDO 400mA; ki_description: Cap free NMOS 400mA Low Drop Adjustable Out Regulator, SOT-23-5; ki_fp_filters: SOT?23*; Footprint: Package_TO_SOT_SMD:SOT-23-5; Supplier: http://www.ti.com/lit/ds/symlink/tps736.pdf
footprint SOT-23-5
pins: 1 IN (power), 2 GND (power), 3 EN (in), 4 FB (in), 5 OUT (power)

## TPS73615DBV
designator *  value TPS73615DBV
ki_keywords: Cap free Fixed LDO 400mA; ki_description: Cap free NMOS 400mA Low Drop 1.5V Regulator, SOT-23-5; ki_fp_filters: SOT?23*; Footprint: Package_TO_SOT_SMD:SOT-23-5; Supplier: http://www.ti.com/lit/ds/symlink/tps736.pdf
footprint SOT-23-5
pins: 1 IN (power), 2 GND (power), 3 EN (in), 4 NR, 5 OUT (power)

## TPS73616DBV
designator *  value TPS73616DBV
ki_keywords: Cap free Fixed LDO 400mA; ki_description: Cap free NMOS 400mA Low Drop 1.6V Regulator, SOT-23-5; ki_fp_filters: SOT?23*; Footprint: Package_TO_SOT_SMD:SOT-23-5; Supplier: http://www.ti.com/lit/ds/symlink/tps736.pdf
footprint SOT-23-5
pins: 1 IN (power), 2 GND (power), 3 EN (in), 4 NR, 5 OUT (power)

## TPS73618DBV
designator *  value TPS73618DBV
ki_keywords: Cap free Fixed LDO 400mA; ki_description: Cap free NMOS 400mA Low Drop 1.8V Regulator, SOT-23-5; ki_fp_filters: SOT?23*; Footprint: Package_TO_SOT_SMD:SOT-23-5; Supplier: http://www.ti.com/lit/ds/symlink/tps736.pdf
footprint SOT-23-5
pins: 1 IN (power), 2 GND (power), 3 EN (in), 4 NR, 5 OUT (power)

## TPS73619DBV
designator *  value TPS73619DBV
ki_keywords: Cap free Fixed LDO 400mA; ki_description: Cap free NMOS 400mA Low Drop 1.9V Regulator, SOT-23-5; ki_fp_filters: SOT?23*; Footprint: Package_TO_SOT_SMD:SOT-23-5; Supplier: http://www.ti.com/lit/ds/symlink/tps736.pdf
footprint SOT-23-5
pins: 1 IN (power), 2 GND (power), 3 EN (in), 4 NR, 5 OUT (power)

## TPS73625DBV
designator *  value TPS73625DBV
ki_keywords: Cap free Fixed LDO 400mA; ki_description: Cap free NMOS 400mA Low Drop 2.5V Regulator, SOT-23-5; ki_fp_filters: SOT?23*; Footprint: Package_TO_SOT_SMD:SOT-23-5; Supplier: http://www.ti.com/lit/ds/symlink/tps736.pdf
footprint SOT-23-5
pins: 1 IN (power), 2 GND (power), 3 EN (in), 4 NR, 5 OUT (power)

## TPS73630DBV
designator *  value TPS73630DBV
ki_keywords: Cap free Fixed LDO 400mA; ki_description: Cap free NMOS 400mA Low Drop 3.0V Regulator, SOT-23-5; ki_fp_filters: SOT?23*; Footprint: Package_TO_SOT_SMD:SOT-23-5; Supplier: http://www.ti.com/lit/ds/symlink/tps736.pdf
footprint SOT-23-5
pins: 1 IN (power), 2 GND (power), 3 EN (in), 4 NR, 5 OUT (power)

## TPS73632DBV
designator *  value TPS73632DBV
ki_keywords: Cap free Fixed LDO 400mA; ki_description: Cap free NMOS 400mA Low Drop 3.2V Regulator, SOT-23-5; ki_fp_filters: SOT?23*; Footprint: Package_TO_SOT_SMD:SOT-23-5; Supplier: http://www.ti.com/lit/ds/symlink/tps736.pdf
footprint SOT-23-5
pins: 1 IN (power), 2 GND (power), 3 EN (in), 4 NR, 5 OUT (power)

## TPS73633DBV
designator *  value TPS73633DBV
ki_keywords: Cap free Fixed LDO 400mA; ki_description: Cap free NMOS 400mA Low Drop 3.3V Regulator, SOT-23-5; ki_fp_filters: SOT?23*; Footprint: Package_TO_SOT_SMD:SOT-23-5; Supplier: http://www.ti.com/lit/ds/symlink/tps736.pdf
footprint SOT-23-5
pins: 1 IN (power), 2 GND (power), 3 EN (in), 4 NR, 5 OUT (power)

## TPS73643DBV
designator *  value TPS73643DBV
ki_keywords: Cap free Fixed LDO 400mA; ki_description: Cap free NMOS 400mA Low Drop 4.3V Regulator, SOT-23-5; ki_fp_filters: SOT?23*; Footprint: Package_TO_SOT_SMD:SOT-23-5; Supplier: http://www.ti.com/lit/ds/symlink/tps736.pdf
footprint SOT-23-5
pins: 1 IN (power), 2 GND (power), 3 EN (in), 4 NR, 5 OUT (power)

## TPS74401_VQFN
designator *  value TPS74401_VQFN
ki_keywords: LDO, Voltage Regulator; ki_description: 0.8 to 3.6V adjustable, 3.0-A, Ultra-LDO with Programmable Soft-Start; ki_fp_filters: Texas*VQFN*RGR* Texas*VQFN*RGW*; Supplier: http://www.ti.com/general/docs/lit/getliterature.tsp?genericPartNumber=tps74401&fileType=pdf
pins: 1 OUT (power), 2 NC (in) hidden, 3 NC (in) hidden, 4 NC (in) hidden, 5 IN (power), 6 IN hidden, 7 IN hidden, 8 IN hidden, 9 PG (out), 10 BIAS (in), 11 EN (in), 12 GND (power), 13 NC (in) hidden, 14 NC (in) hidden, 15 SS (in), 16 FB (in), 17 NC (in) hidden, 18 OUT hidden, 19 OUT hidden, 20 OUT hidden, 21 EP (power)

## TPS75005RGW
designator *  value TPS75005RGW
ki_keywords: Dual LDO Regulator Dual Integrated Power SVS Supervisor; ki_description: Integrated MCU Power Solution, Dual Low Drop-Out Regulator 500mA with Supervisor, VQFN20; ki_fp_filters: QFN*5x5mm*P0.65mm*; Footprint: Package_DFN_QFN:QFN-20-1EP_5x5mm_P0.65mm_EP3.35x3.35mm; Supplier: http://www.ti.com/lit/ds/symlink/tps75005.pdf
footprint QFN-20-1EP_5x5mm_P0.65mm_EP3.35x3.35mm
pins: 1 OUT2 (power), 2 OUT2_S (in), 3 CT2, 4 SS2 (in), 5 VDET (out), 6 GND (power), 7 GND (power), 8 SEQ (in), 9 VSET (in), 10 PG (out), 11 TEST (in) hidden, 12 SS1 (in), 13 CT1, 14 OUT1_S (in), 15 OUT1 (power), 16 VMON (in), 17 EN (in), 18 IN (power), 19 IN (power), 20 NC (in) hidden, 21 PAD (power)

## TPS76301
designator *  value TPS76301
ki_keywords: linear low dropout Regulator adjustable; ki_description: Low power 150mA LDO variable output voltage, SOT-23-5; ki_fp_filters: SOT?23*; Footprint: Package_TO_SOT_SMD:SOT-23-5; Supplier: http://www.ti.com/lit/ds/symlink/tps763.pdf
footprint SOT-23-5
pins: 1 VIN (power), 2 GND (power), 3 EN (in), 4 FB (in), 5 VOUT (power)

## TPS76316
designator *  value TPS76316
ki_keywords: linear low dropout Regulator; ki_description: Low power 150mA LDO, 1.6V fixed output voltage, SOT-23-5; ki_fp_filters: SOT?23*; Footprint: Package_TO_SOT_SMD:SOT-23-5; Supplier: http://www.ti.com/lit/ds/symlink/tps763.pdf
footprint SOT-23-5
pins: 1 VIN (power), 2 GND (power), 3 EN (in), 4 NC (in) hidden, 5 VOUT (power)

## TPS76318
designator *  value TPS76318
ki_keywords: linear low dropout Regulator fixed; ki_description: Low power 150mA LDO 1.8V fixed output voltage, SOT-23-5; ki_fp_filters: SOT?23*; Footprint: Package_TO_SOT_SMD:SOT-23-5; Supplier: http://www.ti.com/lit/ds/symlink/tps763.pdf
footprint SOT-23-5
pins: 1 VIN (power), 2 GND (power), 3 EN (in), 4 NC (in) hidden, 5 VOUT (power)

## TPS76325
designator *  value TPS76325
ki_keywords: linear low dropout Regulator fixed; ki_description: Low power 150mA LDO 2.5V fixed output voltage, SOT-23-5; ki_fp_filters: SOT?23*; Footprint: Package_TO_SOT_SMD:SOT-23-5; Supplier: http://www.ti.com/lit/ds/symlink/tps763.pdf
footprint SOT-23-5
pins: 1 VIN (power), 2 GND (power), 3 EN (in), 4 NC (in) hidden, 5 VOUT (power)